# Altium footprint library SG_PCB_HOLE_Connector.PcbLib: 133 footprints (part 9 of 9)
Each footprint in its own frame and in the unit in brackets; x right, y up, seen from the top. Pads: shape width x height; smd on the part's side, far side on the other; paste and mask are expansions set on the pad; w line width, h text height; cw(c..) or ccw(c..) is an arc to the next point about the centre after c.
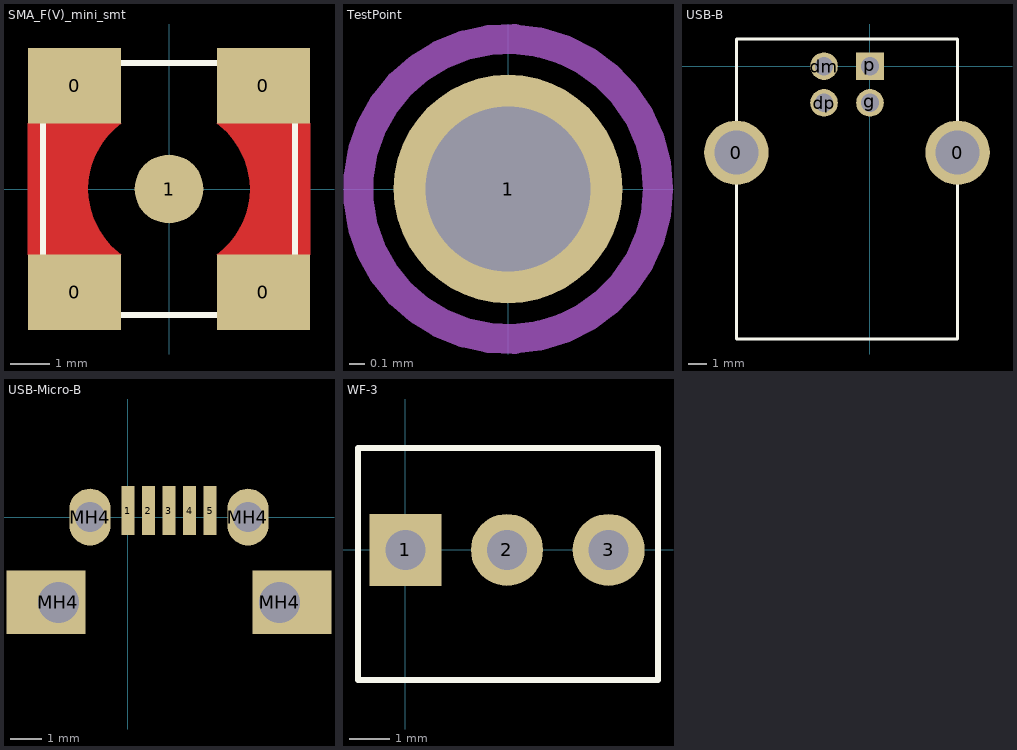
[diagram p8: the footprints below, top view; thin cyan lines are the x and y axes]

## SMA_F(V)_mini_smt [mm] "rf con"
pads (5):
  rect 2.35x1.908 smd: 0(-2.38,-2.606) 0(-2.38,2.606) 0(2.38,-2.606) 0(2.38,2.606)
  round 1.73 smd: 1(0,0)
Top Layer:
  region: -3.555,1.652 -1.205,1.652 -1.381,1.509 -1.529,1.358 -1.668,1.184 -1.75,1.058 -1.859,0.852 -1.948,0.624 -2,0.426 -2.033,0.224 -2.045,0 -2.034,-0.212 -1.978,-0.521 -1.896,-0.767 -1.75,-1.058 -1.622,-1.246 -1.464,-1.428 -1.205,-1.652 -3.555,-1.652
  region: 3.555,-1.652 1.205,-1.652 1.381,-1.509 1.529,-1.358 1.668,-1.184 1.75,-1.058 1.859,-0.852 1.948,-0.624 2,-0.426 2.033,-0.224 2.045,0 2.034,0.212 1.978,0.521 1.896,0.767 1.75,1.058 1.622,1.246 1.464,1.428 1.205,1.652 3.555,1.652
Top Overlay:
  lines w0.152: -3.175,-3.175 -3.175,-3.175 ; -3.175,-3.175 -3.175,3.172 3.175,3.172 3.175,-3.175 -3.175,-3.175
3D body: height 2.29, standoff 0, extent -3.175,-3.175 3.175,3.175
3D body: height 8.84, standoff 0, extent -3.175,-3.172 3.175,3.172

## TestPoint [mil]
pads (1):
  round 60 hole 43.31: 1(0,0)
Top Courtyard:
  circle w7.87: c0,0 r39.37

## USB-B [mm]
pads (6):
  round 3.5 hole 2.4 mask+0.05: 0(-7.27,-4.71) 0(4.77,-4.71)
  round 1.5 hole 1 mask+0.05: dm(-2.5,0) dp(-2.5,-2) g(0,-2)
  rect 1.5x1.5 hole 1 mask+0.05: p(0,0)
Top Overlay:
  lines w0.15: -7.27,-14.85 -7.27,1.475 4.77,1.475 4.77,-14.85 -7.27,-14.85
3D body "USB B.STEP": height 12, standoff -2.64, extent -8.675,-15 6.123,1.5

## USB-Micro-B [mm]
pads (9):
  rect 0.4x1.55 smd: 1(0,0.2) 2(0.65,0.2) 3(1.3,0.2) 4(1.95,0.2) 5(2.6,0.2)
  rect 2.5x2 hole 1.3 copper offset -0.4,0: MH4(-2.2,-2.7)
  oval 1.3x1.8 hole 0.95: MH4(-1.2,0) MH4(3.8,0)
  rect 2.5x2 hole 1.3 copper offset 0.4,0: MH4(4.8,-2.7)
3D body "Micro USB-B Female 5Pin SMD.STEP": height 2.7, standoff -1.02, extent -2.7,-5.325 5.35,0.475

## WF-3 [mm]
height 12
pads (3):
  rect 1.8x1.8 hole 1: 1(0,0)
  round 1.8 hole 1: 2(2.54,0) 3(5.08,0)
Top Overlay:
  lines w0.152: -1.185,-3.251 -1.185,2.549 6.315,2.549 6.315,-3.251 -1.185,-3.251
3D body "WF-3-1.STEP": height 11.62, standoff -2.78, extent -1.185,-3.251 6.315,2.549